# Altium footprint library COMATEL THD.PcbLib: 70 footprints (part 4 of 5)
Each footprint in its own frame and in the unit in brackets; x right, y up, seen from the top. Pads: shape width x height; smd on the part's side, far side on the other; paste and mask are expansions set on the pad; w line width, h text height; cw(c..) or ccw(c..) is an arc to the next point about the centre after c.
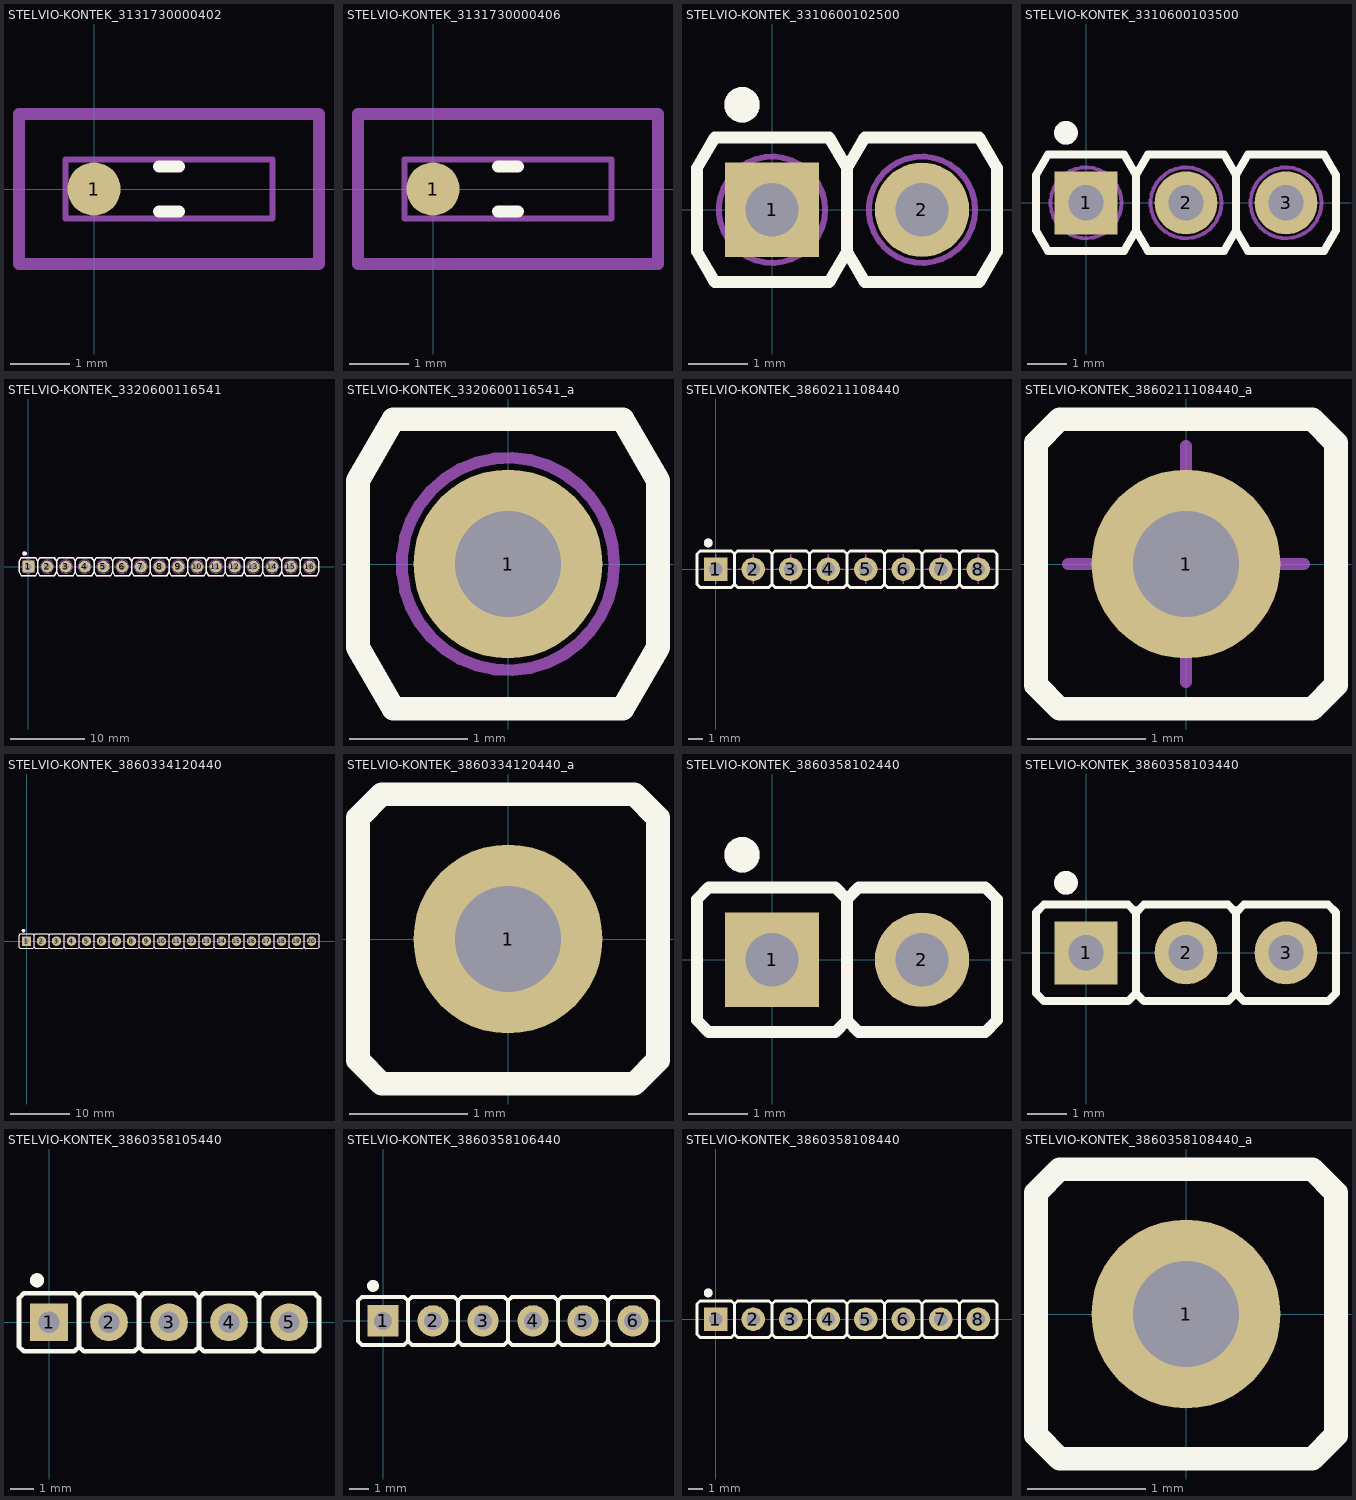
[diagram p3: the footprints below, top view; thin cyan lines are the x and y axes]

## STELVIO-KONTEK_3131730000402 [mm] "Red Insulated Jumper Pitch 2.54mm W=2.5mm L=5mm H=6.5mm"
height 6.5
pads (1):
  round 0.9 smd paste-0.46 mask-0.46: 1(0,0)
Top Overlay:
  lines w0.2: 1.1,-0.381 1.44,-0.381 ; 1.1,0.381 1.44,0.381
Mechanical 13:
  lines w0.2: -1.27,-1.27 3.81,-1.27 3.81,1.27 -1.27,1.27 -1.27,-1.27
Mechanical 14:
  lines w0.1: -0.48,-0.5 3.02,-0.5 3.02,0.5 -0.48,0.5 -0.48,-0.5
3D body "STELVIO-KONTEK_3131730000402.stp": height 6.5, standoff 0, extent -1.23,-1.25 3.77,1.25

## STELVIO-KONTEK_3131730000406 [mm] "Blue Insulated Jumper Pitch 2.54mm W=2.5mm L=5mm H=6.5mm"
height 6.5
pads (1):
  round 0.9 smd paste-0.46 mask-0.46: 1(0,0)
Top Overlay:
  lines w0.2: 1.1,-0.381 1.44,-0.381 ; 1.1,0.381 1.44,0.381
Mechanical 13:
  lines w0.2: -1.27,-1.27 3.81,-1.27 3.81,1.27 -1.27,1.27 -1.27,-1.27
Mechanical 14:
  lines w0.1: -0.48,-0.5 3.02,-0.5 3.02,0.5 -0.48,0.5 -0.48,-0.5
3D body "STELVIO-KONTEK_3131730000406.stp": height 6.5, standoff 0, extent -1.23,-1.25 3.77,1.25

## STELVIO-KONTEK_3310600102500 [mm] "2 \"U\" Pins Strip Terminals Components Support, Pitch 2.54mm"
height 5.7
pads (2):
  rect 1.6x1.6 hole 0.9: 1(0,0)
  round 1.6 hole 0.9: 2(2.54,0)
Top Overlay:
  circle w0.3: c-0.508,1.778 r0.15
  lines w0.2: 1.27,-0.705 0.97,-1.225 -0.97,-1.225 -1.27,-0.705 -1.27,0.705 -0.97,1.225 0.97,1.225 1.27,0.705 ; 1.27,-0.705 1.27,0.705 ; 1.27,-0.705 1.57,-1.225 3.51,-1.225 3.81,-0.705 3.81,0.705 3.51,1.225 1.57,1.225 1.27,0.705 ; 1.27,-0.705 1.27,0.705
Mechanical 14:
  circle w0.1: c0,0 r0.9
  circle w0.1: c2.54,0 r0.9
  circle w0.3: c-0.508,1.778 r0.15
  lines w0.1: 1.27,-0.705 0.97,-1.225 -0.97,-1.225 -1.27,-0.705 -1.27,0.705 -0.97,1.225 0.97,1.225 1.27,0.705 ; 1.27,-0.705 1.27,0.705 ; 1.27,-0.705 1.57,-1.225 3.51,-1.225 3.81,-0.705 3.81,0.705 3.51,1.225 1.57,1.225 1.27,0.705 ; 1.27,-0.705 1.27,0.705
3D body "STELVIO-KONTEK_3310600102500.stp": height 5.7, standoff -3, extent -1.27,-1.225 3.81,1.225

## STELVIO-KONTEK_3310600103500 [mm] "3 \"U\" Pins Strip Terminals Components Support, Pitch 2.54mm"
height 5.7
pads (3):
  rect 1.6x1.6 hole 0.9: 1(0,0)
  round 1.6 hole 0.9: 2(2.54,0) 3(5.08,0)
Top Overlay:
  circle w0.3: c-0.508,1.778 r0.15
  lines w0.2: 1.27,-0.705 1.27,0.705 ; 1.27,-0.705 1.57,-1.225 3.51,-1.225 3.81,-0.705 ; 1.27,-0.705 1.27,0.705 ; 1.27,-0.705 0.97,-1.225 -0.97,-1.225 -1.27,-0.705 -1.27,0.705 -0.97,1.225 0.97,1.225 1.27,0.705 ; 1.27,0.705 1.57,1.225 3.51,1.225 3.81,0.705 ; 3.81,-0.705 3.81,0.705 ; 3.81,-0.705 4.11,-1.225 6.05,-1.225 6.35,-0.705 6.35,0.705 6.05,1.225 4.11,1.225 3.81,0.705 ; 3.81,-0.705 3.81,0.705
Mechanical 14:
  circle w0.1: c5.08,0 r0.9
  circle w0.1: c2.54,0 r0.9
  circle w0.1: c0,0 r0.9
  circle w0.3: c-0.508,1.778 r0.15
  lines w0.1: 1.27,-0.705 1.27,0.705 ; 1.27,-0.705 1.57,-1.225 3.51,-1.225 3.81,-0.705 ; 1.27,-0.705 1.27,0.705 ; 1.27,-0.705 0.97,-1.225 -0.97,-1.225 -1.27,-0.705 -1.27,0.705 -0.97,1.225 0.97,1.225 1.27,0.705 ; 1.27,0.705 1.57,1.225 3.51,1.225 3.81,0.705 ; 3.81,-0.705 3.81,0.705 ; 3.81,-0.705 4.11,-1.225 6.05,-1.225 6.35,-0.705 6.35,0.705 6.05,1.225 4.11,1.225 3.81,0.705 ; 3.81,-0.705 3.81,0.705
3D body "STELVIO-KONTEK_3310600103500.stp": height 5.7, standoff -3, extent -1.27,-1.225 6.35,1.225

## STELVIO-KONTEK_3320600116541 [mm] "1of 16 \"U\" Pins Strip Terminals Components Support, Pitch 2.54mm"
height 5.7
pads (16):
  rect 1.6x1.6 hole 0.9: 1(0,0)
  round 1.6 hole 0.9: 2(2.54,0) 3(5.08,0) 4(7.62,0) 5(10.16,0) 6(12.7,0) 7(15.24,0) 8(17.78,0) 9(20.32,0) 10(22.86,0) 11(25.4,0) 12(27.94,0) 13(30.48,0) 14(33.02,0) 15(35.56,0) 16(38.1,0)
Top Overlay:
  circle w0.3: c-0.508,1.778 r0.15
  lines w0.2: 1.27,-0.705 1.57,-1.225 3.51,-1.225 3.81,-0.705 ; 1.27,-0.705 0.97,-1.225 -0.97,-1.225 -1.27,-0.705 -1.27,0.705 -0.97,1.225 0.97,1.225 1.27,0.705 ; 1.27,-0.705 1.27,0.705 ; 1.27,0.705 1.57,1.225 3.51,1.225 3.81,0.705 ; 3.81,-0.705 4.11,-1.225 6.05,-1.225 6.35,-0.705 ; 3.81,-0.705 3.81,0.705 ; 3.81,0.705 4.11,1.225 6.05,1.225 6.35,0.705 ; 6.35,-0.705 6.65,-1.225 8.59,-1.225 8.89,-0.705 ; 6.35,-0.705 6.35,0.705 ; 6.35,0.705 6.65,1.225 8.59,1.225 8.89,0.705 ; 8.89,-0.705 9.19,-1.225 11.13,-1.225 11.43,-0.705 ; 8.89,-0.705 8.89,0.705 ; 8.89,0.705 9.19,1.225 11.13,1.225 11.43,0.705 ; 11.43,-0.705 11.73,-1.225 13.67,-1.225 13.97,-0.705 ; 11.43,-0.705 11.43,0.705 ; 11.43,0.705 11.73,1.225 13.67,1.225 13.97,0.705 ; 13.97,-0.705 14.27,-1.225 16.21,-1.225 16.51,-0.705 ; 13.97,-0.705 13.97,0.705 ; 13.97,0.705 14.27,1.225 16.21,1.225 16.51,0.705 ; 16.51,-0.705 16.81,-1.225 18.75,-1.225 19.05,-0.705 ; 16.51,-0.705 16.51,0.705 ; 16.51,0.705 16.81,1.225 18.75,1.225 19.05,0.705 ; 19.05,-0.705 19.35,-1.225 21.29,-1.225 21.59,-0.705 ; 19.05,-0.705 19.05,0.705 ; 19.05,0.705 19.35,1.225 21.29,1.225 21.59,0.705 ; 21.59,-0.705 21.89,-1.225 23.83,-1.225 24.13,-0.705 ; 21.59,-0.705 21.59,0.705 ; 21.59,0.705 21.89,1.225 23.83,1.225 24.13,0.705 ; 24.13,-0.705 24.43,-1.225 26.37,-1.225 26.67,-0.705 ; 24.13,-0.705 24.13,0.705 ; 24.13,0.705 24.43,1.225 26.37,1.225 26.67,0.705 ; 26.67,-0.705 26.97,-1.225 28.91,-1.225 29.21,-0.705 ; 26.67,-0.705 26.67,0.705 ; 26.67,0.705 26.97,1.225 28.91,1.225 29.21,0.705 ; 29.21,-0.705 29.51,-1.225 31.45,-1.225 31.75,-0.705 ; 29.21,-0.705 29.21,0.705 ; 29.21,0.705 29.51,1.225 31.45,1.225 31.75,0.705 ; 31.75,-0.705 32.05,-1.225 33.99,-1.225 34.29,-0.705 ; 31.75,-0.705 31.75,0.705 ; 31.75,0.705 32.05,1.225 33.99,1.225 34.29,0.705 ; 34.29,-0.705 34.59,-1.225 36.53,-1.225 36.83,-0.705 ; 34.29,-0.705 34.29,0.705 ; 34.29,0.705 34.59,1.225 36.53,1.225 36.83,0.705 ; 36.83,-0.705 37.13,-1.225 39.07,-1.225 39.37,-0.705 39.37,0.705 39.07,1.225 37.13,1.225 36.83,0.705 ; 36.83,-0.705 36.83,0.705
Mechanical 8:
  lines w0.1: -0.5,0 0,0 ; 0,-0.5 0,0 ; 0,0.5 0,0 ; 0.5,0 0,0 ; 2.04,0 2.54,0 ; 2.54,-0.5 2.54,0 ; 2.54,0.5 2.54,0 ; 3.04,0 2.54,0 ; 4.58,0 5.08,0 ; 5.08,-0.5 5.08,0 ; 5.08,0.5 5.08,0 ; 5.58,0 5.08,0 ; 7.12,0 7.62,0 ; 7.62,-0.5 7.62,0 ; 7.62,0.5 7.62,0 ; 8.12,0 7.62,0 ; 9.66,0 10.16,0 ; 10.16,-0.5 10.16,0 ; 10.16,0.5 10.16,0 ; 10.66,0 10.16,0 ; 12.2,0 12.7,0 ; 12.7,-0.5 12.7,0 ; 12.7,0.5 12.7,0 ; 13.2,0 12.7,0 ; 14.74,0 15.24,0 ; 15.24,-0.5 15.24,0 ; 15.24,0.5 15.24,0 ; 15.74,0 15.24,0 ; 17.28,0 17.78,0 ; 17.78,-0.5 17.78,0 ; 17.78,0.5 17.78,0 ; 18.28,0 17.78,0 ; 19.82,0 20.32,0 ; 20.32,-0.5 20.32,0 ; 20.32,0.5 20.32,0 ; 20.82,0 20.32,0 ; 22.36,0 22.86,0 ; 22.86,-0.5 22.86,0 ; 22.86,0.5 22.86,0 ; 23.36,0 22.86,0 ; 24.9,0 25.4,0 ; 25.4,-0.5 25.4,0 ; 25.4,0.5 25.4,0 ; 25.9,0 25.4,0 ; 27.44,0 27.94,0 ; 27.94,-0.5 27.94,0 ; 27.94,0.5 27.94,0 ; 28.44,0 27.94,0 ; 29.98,0 30.48,0 ; 30.48,-0.5 30.48,0 ; 30.48,0.5 30.48,0 ; 30.98,0 30.48,0 ; 32.52,0 33.02,0 ; 33.02,-0.5 33.02,0 ; 33.02,0.5 33.02,0 ; 33.52,0 33.02,0 ; 35.06,0 35.56,0 ; 35.56,-0.5 35.56,0 ; 35.56,0.5 35.56,0 ; 36.06,0 35.56,0 ; 37.6,0 38.1,0 ; 38.1,-0.5 38.1,0 ; 38.1,0.5 38.1,0 ; 38.6,0 38.1,0
Mechanical 14:
  circle w0.3: c-0.508,1.778 r0.15
  circle w0.1: c38.1,0 r0.9
  circle w0.1: c35.56,0 r0.9
  circle w0.1: c33.02,0 r0.9
  circle w0.1: c30.48,0 r0.9
  circle w0.1: c27.94,0 r0.9
  circle w0.1: c25.4,0 r0.9
  circle w0.1: c22.86,0 r0.9
  circle w0.1: c20.32,0 r0.9
  circle w0.1: c17.78,0 r0.9
  circle w0.1: c15.24,0 r0.9
  circle w0.1: c12.7,0 r0.9
  circle w0.1: c10.16,0 r0.9
  circle w0.1: c7.62,0 r0.9
  circle w0.1: c5.08,0 r0.9
  circle w0.1: c2.54,0 r0.9
  circle w0.1: c0,0 r0.9
  lines w0.1: 1.27,-0.705 1.57,-1.225 3.51,-1.225 3.81,-0.705 ; 1.27,-0.705 0.97,-1.225 -0.97,-1.225 -1.27,-0.705 -1.27,0.705 -0.97,1.225 0.97,1.225 1.27,0.705 ; 1.27,-0.705 1.27,0.705 ; 1.27,0.705 1.57,1.225 3.51,1.225 3.81,0.705 ; 3.81,-0.705 4.11,-1.225 6.05,-1.225 6.35,-0.705 ; 3.81,-0.705 3.81,0.705 ; 3.81,0.705 4.11,1.225 6.05,1.225 6.35,0.705 ; 6.35,-0.705 6.65,-1.225 8.59,-1.225 8.89,-0.705 ; 6.35,-0.705 6.35,0.705 ; 6.35,0.705 6.65,1.225 8.59,1.225 8.89,0.705 ; 8.89,-0.705 9.19,-1.225 11.13,-1.225 11.43,-0.705 ; 8.89,-0.705 8.89,0.705 ; 8.89,0.705 9.19,1.225 11.13,1.225 11.43,0.705 ; 11.43,-0.705 11.73,-1.225 13.67,-1.225 13.97,-0.705 ; 11.43,-0.705 11.43,0.705 ; 11.43,0.705 11.73,1.225 13.67,1.225 13.97,0.705 ; 13.97,-0.705 14.27,-1.225 16.21,-1.225 16.51,-0.705 ; 13.97,-0.705 13.97,0.705 ; 13.97,0.705 14.27,1.225 16.21,1.225 16.51,0.705 ; 16.51,-0.705 16.81,-1.225 18.75,-1.225 19.05,-0.705 ; 16.51,-0.705 16.51,0.705 ; 16.51,0.705 16.81,1.225 18.75,1.225 19.05,0.705 ; 19.05,-0.705 19.35,-1.225 21.29,-1.225 21.59,-0.705 ; 19.05,-0.705 19.05,0.705 ; 19.05,0.705 19.35,1.225 21.29,1.225 21.59,0.705 ; 21.59,-0.705 21.89,-1.225 23.83,-1.225 24.13,-0.705 ; 21.59,-0.705 21.59,0.705 ; 21.59,0.705 21.89,1.225 23.83,1.225 24.13,0.705 ; 24.13,-0.705 24.43,-1.225 26.37,-1.225 26.67,-0.705 ; 24.13,-0.705 24.13,0.705 ; 24.13,0.705 24.43,1.225 26.37,1.225 26.67,0.705 ; 26.67,-0.705 26.97,-1.225 28.91,-1.225 29.21,-0.705 ; 26.67,-0.705 26.67,0.705 ; 26.67,0.705 26.97,1.225 28.91,1.225 29.21,0.705 ; 29.21,-0.705 29.51,-1.225 31.45,-1.225 31.75,-0.705 ; 29.21,-0.705 29.21,0.705 ; 29.21,0.705 29.51,1.225 31.45,1.225 31.75,0.705 ; 31.75,-0.705 32.05,-1.225 33.99,-1.225 34.29,-0.705 ; 31.75,-0.705 31.75,0.705 ; 31.75,0.705 32.05,1.225 33.99,1.225 34.29,0.705 ; 34.29,-0.705 34.59,-1.225 36.53,-1.225 36.83,-0.705 ; 34.29,-0.705 34.29,0.705 ; 34.29,0.705 34.59,1.225 36.53,1.225 36.83,0.705 ; 36.83,-0.705 37.13,-1.225 39.07,-1.225 39.37,-0.705 39.37,0.705 39.07,1.225 37.13,1.225 36.83,0.705 ; 36.83,-0.705 36.83,0.705
3D body "STELVIO-KONTEK_3320600116541.stp": height 5.7, standoff -3, extent -1.27,-1.225 39.37,1.225

## STELVIO-KONTEK_3320600116541_a [mm] "1of1 of 1 of 16 \"U\" Pins Strip Terminals Components Support, Pitch 2.54mm"
height 5.7
pads (1):
  round 1.6 hole 0.9: 1(0,0)
Top Overlay:
  lines w0.2: -1.27,-0.705 -0.97,-1.225 0.97,-1.225 1.27,-0.705 1.27,0.705 0.97,1.225 -0.97,1.225 -1.27,0.705 -1.27,-0.705
Mechanical 14:
  circle w0.1: c0,0 r0.9
  lines w0.1: -1.27,-0.705 -0.97,-1.225 0.97,-1.225 1.27,-0.705 1.27,0.705 0.97,1.225 -0.97,1.225 -1.27,0.705 -1.27,-0.705
3D body "STELVIO-KONTEK_3320600116541_a.stp": height 5.7, standoff -3, extent -1.27,-1.225 1.27,1.225

## STELVIO-KONTEK_3860211108440 [mm] "Wire-Wrap contact (Pin Length= 16.5mm)"
height 18.2
pads (8):
  rect 1.6x1.6 hole 0.9: 1(0,0)
  round 1.6 hole 0.9: 2(2.54,0) 3(5.08,0) 4(7.62,0) 5(10.16,0) 6(12.7,0) 7(15.24,0) 8(17.78,0)
Top Overlay:
  circle w0.3: c-0.508,1.778 r0.15
  lines w0.2: 1.27,-1.025 1.27,1.025 ; 1.27,-1.025 1.47,-1.225 3.61,-1.225 3.81,-1.025 ; 1.27,-1.025 1.27,1.025 ; 1.27,-1.025 1.07,-1.225 -1.07,-1.225 -1.27,-1.025 -1.27,1.025 -1.07,1.225 1.07,1.225 1.27,1.025 ; 1.27,1.025 1.47,1.225 3.61,1.225 3.81,1.025 ; 3.81,-1.025 3.81,1.025 ; 3.81,-1.025 4.01,-1.225 6.15,-1.225 6.35,-1.025 ; 3.81,-1.025 3.81,1.025 ; 3.81,1.025 4.01,1.225 6.15,1.225 6.35,1.025 ; 6.35,-1.025 6.35,1.025 ; 6.35,-1.025 6.55,-1.225 8.69,-1.225 8.89,-1.025 ; 6.35,-1.025 6.35,1.025 ; 6.35,1.025 6.55,1.225 8.69,1.225 8.89,1.025 ; 8.89,-1.025 8.89,1.025 ; 8.89,-1.025 9.09,-1.225 11.23,-1.225 11.43,-1.025 ; 8.89,-1.025 8.89,1.025 ; 8.89,1.025 9.09,1.225 11.23,1.225 11.43,1.025 ; 11.43,-1.025 11.43,1.025 ; 11.43,-1.025 11.63,-1.225 13.77,-1.225 13.97,-1.025 ; 11.43,-1.025 11.43,1.025 ; 11.43,1.025 11.63,1.225 13.77,1.225 13.97,1.025 ; 13.97,-1.025 13.97,1.025 ; 13.97,-1.025 14.17,-1.225 16.31,-1.225 16.51,-1.025 ; 13.97,-1.025 13.97,1.025 ; 13.97,1.025 14.17,1.225 16.31,1.225 16.51,1.025 ; 16.51,-1.025 16.51,1.025 ; 16.51,-1.025 16.71,-1.225 18.85,-1.225 19.05,-1.025 19.05,1.025 18.85,1.225 16.71,1.225 16.51,1.025 ; 16.51,-1.025 16.51,1.025
Mechanical 8:
  lines w0.1: -1,0 0,0 ; 0,-1 0,0 ; 0,1 0,0 ; 1,0 0,0 ; 1.54,0 2.54,0 ; 2.54,-1 2.54,0 ; 2.54,1 2.54,0 ; 3.54,0 2.54,0 ; 4.08,0 5.08,0 ; 5.08,-1 5.08,0 ; 5.08,1 5.08,0 ; 6.08,0 5.08,0 ; 6.62,0 7.62,0 ; 7.62,-1 7.62,0 ; 7.62,1 7.62,0 ; 8.62,0 7.62,0 ; 9.16,0 10.16,0 ; 10.16,-1 10.16,0 ; 10.16,1 10.16,0 ; 11.16,0 10.16,0 ; 11.7,0 12.7,0 ; 12.7,-1 12.7,0 ; 12.7,1 12.7,0 ; 13.7,0 12.7,0 ; 14.24,0 15.24,0 ; 15.24,-1 15.24,0 ; 15.24,1 15.24,0 ; 16.24,0 15.24,0 ; 16.78,0 17.78,0 ; 17.78,-1 17.78,0 ; 17.78,1 17.78,0 ; 18.78,0 17.78,0
Mechanical 14:
  circle w0.3: c-0.508,1.778 r0.15
  lines w0.1: 1.27,-1.025 1.47,-1.225 3.61,-1.225 3.81,-1.025 ; 1.27,-1.025 1.27,1.025 ; 1.27,-1.025 1.07,-1.225 -1.07,-1.225 -1.27,-1.025 -1.27,1.025 -1.07,1.225 1.07,1.225 1.27,1.025 ; 1.27,-1.025 1.27,1.025 ; 1.27,1.025 1.47,1.225 3.61,1.225 3.81,1.025 ; 3.81,-1.025 4.01,-1.225 6.15,-1.225 6.35,-1.025 ; 3.81,-1.025 3.81,1.025 ; 3.81,-1.025 3.81,1.025 ; 3.81,1.025 4.01,1.225 6.15,1.225 6.35,1.025 ; 6.35,-1.025 6.55,-1.225 8.69,-1.225 8.89,-1.025 ; 6.35,-1.025 6.35,1.025 ; 6.35,-1.025 6.35,1.025 ; 6.35,1.025 6.55,1.225 8.69,1.225 8.89,1.025 ; 8.89,-1.025 9.09,-1.225 11.23,-1.225 11.43,-1.025 ; 8.89,-1.025 8.89,1.025 ; 8.89,-1.025 8.89,1.025 ; 8.89,1.025 9.09,1.225 11.23,1.225 11.43,1.025 ; 11.43,-1.025 11.63,-1.225 13.77,-1.225 13.97,-1.025 ; 11.43,-1.025 11.43,1.025 ; 11.43,-1.025 11.43,1.025 ; 11.43,1.025 11.63,1.225 13.77,1.225 13.97,1.025 ; 13.97,-1.025 14.17,-1.225 16.31,-1.225 16.51,-1.025 ; 13.97,-1.025 13.97,1.025 ; 13.97,-1.025 13.97,1.025 ; 13.97,1.025 14.17,1.225 16.31,1.225 16.51,1.025 ; 16.51,-1.025 16.71,-1.225 18.85,-1.225 19.05,-1.025 19.05,1.025 18.85,1.225 16.71,1.225 16.51,1.025 ; 16.51,-1.025 16.51,1.025 ; 16.51,-1.025 16.51,1.025
3D body "STELVIO-KONTEK_3860211108440.stp": height 18.2, standoff -3.8, extent -1.27,-1.225 19.05,1.225

## STELVIO-KONTEK_3860211108440_a [mm] "Wire-Wrap contact (Pin Length= 16.5mm)"
height 18.2
pads (1):
  round 1.6 hole 0.9: 1(0,0)
Top Overlay:
  lines w0.2: -1.27,-1.025 -1.27,1.025 -1.07,1.225 1.07,1.225 1.27,1.025 1.27,-1.025 1.07,-1.225 -1.07,-1.225 -1.27,-1.025
Mechanical 8:
  lines w0.1: -1,0 0,0 ; 0,-1 0,0 ; 0,1 0,0 ; 1,0 0,0
Mechanical 14:
  lines w0.1: -1.27,-1.025 -1.07,-1.225 1.07,-1.225 1.27,-1.025 1.27,1.025 1.07,1.225 -1.07,1.225 -1.27,1.025 -1.27,-1.025
3D body "STELVIO-KONTEK_3860211108440_a.stp": height 18.2, standoff -3.8, extent -1.27,-1.225 1.27,1.225

## STELVIO-KONTEK_3860334120440 [mm] "Wire-Wrap contact (Pin Length= 7.5mm)"
height 9.2
pads (20):
  rect 1.6x1.6 hole 0.9: 1(0,0)
  round 1.6 hole 0.9: 2(2.54,0) 3(5.08,0) 4(7.62,0) 5(10.16,0) 6(12.7,0) 7(15.24,0) 8(17.78,0) 9(20.32,0) 10(22.86,0) 11(25.4,0) 12(27.94,0) 13(30.48,0) 14(33.02,0) 15(35.56,0) 16(38.1,0) 17(40.64,0) 18(43.18,0) 19(45.72,0) 20(48.26,0)
Top Overlay:
  drawing of 161 lines, arcs and shapes, not listed
Mechanical 14:
  drawing of 161 lines, arcs and shapes, not listed
3D body "STELVIO-KONTEK_3860334120440.stp": height 9.2, standoff -3.3, extent -1.27,-1.225 49.53,1.225

## STELVIO-KONTEK_3860334120440_a [mm] "Wire-Wrap contact (Pin Length= 7.5mm)"
height 9.2
pads (1):
  round 1.6 hole 0.9: 1(0,0)
Top Overlay:
  lines w0.2: -1.27,-1.025 -1.27,1.025 -1.07,1.225 1.07,1.225 1.27,1.025 1.27,-1.025 1.07,-1.225 -1.07,-1.225 -1.27,-1.025
Mechanical 14:
  lines w0.1: -1.27,-1.025 -1.07,-1.225 1.07,-1.225 1.27,-1.025 1.27,1.025 1.07,1.225 -1.07,1.225 -1.27,1.025 -1.27,-1.025
3D body "STELVIO-KONTEK_3860334120440_a.stp": height 9.2, standoff -3.3, extent -1.27,-1.225 1.27,1.225

## STELVIO-KONTEK_3860358102440 [mm] "2 Contacts Straight Strip Header Pitch 2.54mm L=6.3mm ''Mini-Wire-Wrap''"
height 8
pads (2):
  rect 1.6x1.6 hole 0.9: 1(0,0)
  round 1.6 hole 0.9: 2(2.54,0)
Top Overlay:
  circle w0.3: c-0.508,1.778 r0.15
  lines w0.2: 1.27,-1.025 1.07,-1.225 -1.07,-1.225 -1.27,-1.025 -1.27,1.025 -1.07,1.225 1.07,1.225 1.27,1.025 ; 1.27,-1.025 1.27,1.025 ; 1.27,-1.025 1.47,-1.225 3.61,-1.225 3.81,-1.025 3.81,1.025 3.61,1.225 1.47,1.225 1.27,1.025
Mechanical 14:
  circle w0.3: c-0.508,1.778 r0.15
  lines w0.1: 1.27,-1.025 1.07,-1.225 -1.07,-1.225 -1.27,-1.025 -1.27,1.025 -1.07,1.225 1.07,1.225 1.27,1.025 ; 1.27,-1.025 1.27,1.025 ; 1.27,-1.025 1.47,-1.225 3.61,-1.225 3.81,-1.025 3.81,1.025 3.61,1.225 1.47,1.225 1.27,1.025
3D body "STELVIO-KONTEK_3860358102440.stp": height 8, standoff -3.2, extent -1.27,-1.225 3.81,1.225

## STELVIO-KONTEK_3860358103440 [mm] "3 Contacts Straight Strip Header Pitch 2.54mm L=6.3mm ''Mini-Wire-Wrap''"
height 8
pads (3):
  rect 1.6x1.6 hole 0.9: 1(0,0)
  round 1.6 hole 0.9: 2(2.54,0) 3(5.08,0)
Top Overlay:
  circle w0.3: c-0.508,1.778 r0.15
  lines w0.2: 1.27,-1.025 1.47,-1.225 3.61,-1.225 3.81,-1.025 ; 1.27,-1.025 1.27,1.025 ; 1.27,-1.025 1.07,-1.225 -1.07,-1.225 -1.27,-1.025 -1.27,1.025 -1.07,1.225 1.07,1.225 1.27,1.025 ; 1.27,1.025 1.47,1.225 3.61,1.225 3.81,1.025 ; 3.81,-1.025 4.01,-1.225 6.15,-1.225 6.35,-1.025 6.35,1.025 6.15,1.225 4.01,1.225 3.81,1.025 ; 3.81,-1.025 3.81,1.025
Mechanical 14:
  circle w0.3: c-0.508,1.778 r0.15
  lines w0.1: 1.27,-1.025 1.47,-1.225 3.61,-1.225 3.81,-1.025 ; 1.27,-1.025 1.27,1.025 ; 1.27,-1.025 1.07,-1.225 -1.07,-1.225 -1.27,-1.025 -1.27,1.025 -1.07,1.225 1.07,1.225 1.27,1.025 ; 1.27,1.025 1.47,1.225 3.61,1.225 3.81,1.025 ; 3.81,-1.025 4.01,-1.225 6.15,-1.225 6.35,-1.025 6.35,1.025 6.15,1.225 4.01,1.225 3.81,1.025 ; 3.81,-1.025 3.81,1.025
3D body "STELVIO-KONTEK_3860358103440.stp": height 8, standoff -3.2, extent -1.27,-1.225 6.35,1.225

## STELVIO-KONTEK_3860358105440 [mm] "5 Contacts Straight Strip Header Pitch 2.54mm L=6.3mm ''Mini-Wire-Wrap''"
height 8
pads (5):
  rect 1.6x1.6 hole 0.9: 1(0,0)
  round 1.6 hole 0.9: 2(2.54,0) 3(5.08,0) 4(7.62,0) 5(10.16,0)
Top Overlay:
  circle w0.3: c-0.508,1.778 r0.15
  lines w0.2: 1.27,-1.025 1.47,-1.225 3.61,-1.225 3.81,-1.025 ; 1.27,-1.025 1.27,1.025 ; 1.27,-1.025 1.07,-1.225 -1.07,-1.225 -1.27,-1.025 -1.27,1.025 -1.07,1.225 1.07,1.225 1.27,1.025 ; 1.27,1.025 1.47,1.225 3.61,1.225 3.81,1.025 ; 3.81,-1.025 4.01,-1.225 6.15,-1.225 6.35,-1.025 ; 3.81,-1.025 3.81,1.025 ; 3.81,1.025 4.01,1.225 6.15,1.225 6.35,1.025 ; 6.35,-1.025 6.55,-1.225 8.69,-1.225 8.89,-1.025 ; 6.35,-1.025 6.35,1.025 ; 6.35,1.025 6.55,1.225 8.69,1.225 8.89,1.025 ; 8.89,-1.025 8.89,1.025 ; 8.89,-1.025 9.09,-1.225 11.23,-1.225 11.43,-1.025 11.43,1.025 11.23,1.225 9.09,1.225 8.89,1.025
Mechanical 14:
  circle w0.3: c-0.508,1.778 r0.15
  lines w0.1: 1.27,-1.025 1.47,-1.225 3.61,-1.225 3.81,-1.025 ; 1.27,-1.025 1.27,1.025 ; 1.27,-1.025 1.07,-1.225 -1.07,-1.225 -1.27,-1.025 -1.27,1.025 -1.07,1.225 1.07,1.225 1.27,1.025 ; 1.27,1.025 1.47,1.225 3.61,1.225 3.81,1.025 ; 3.81,-1.025 4.01,-1.225 6.15,-1.225 6.35,-1.025 ; 3.81,-1.025 3.81,1.025 ; 3.81,1.025 4.01,1.225 6.15,1.225 6.35,1.025 ; 6.35,-1.025 6.35,1.025 ; 6.35,-1.025 6.55,-1.225 8.69,-1.225 8.89,-1.025 ; 6.35,1.025 6.55,1.225 8.69,1.225 8.89,1.025 ; 8.89,-1.025 8.89,1.025 ; 8.89,-1.025 9.09,-1.225 11.23,-1.225 11.43,-1.025 11.43,1.025 11.23,1.225 9.09,1.225 8.89,1.025
3D body "STELVIO-KONTEK_3860358105440.stp": height 8, standoff -3.2, extent -1.27,-1.225 11.43,1.225

## STELVIO-KONTEK_3860358106440 [mm] "6 Contacts Straight Strip Header Pitch 2.54mm L=6.3mm ''Mini-Wire-Wrap''"
height 8
pads (6):
  rect 1.6x1.6 hole 0.9: 1(0,0)
  round 1.6 hole 0.9: 2(2.54,0) 3(5.08,0) 4(7.62,0) 5(10.16,0) 6(12.7,0)
Top Overlay:
  circle w0.3: c-0.508,1.778 r0.15
  lines w0.2: 1.27,-1.025 1.47,-1.225 3.61,-1.225 3.81,-1.025 ; 1.27,-1.025 1.27,1.025 ; 1.27,-1.025 1.07,-1.225 -1.07,-1.225 -1.27,-1.025 -1.27,1.025 -1.07,1.225 1.07,1.225 1.27,1.025 ; 1.27,1.025 1.47,1.225 3.61,1.225 3.81,1.025 ; 3.81,-1.025 4.01,-1.225 6.15,-1.225 6.35,-1.025 ; 3.81,-1.025 3.81,1.025 ; 3.81,1.025 4.01,1.225 6.15,1.225 6.35,1.025 ; 6.35,-1.025 6.55,-1.225 8.69,-1.225 8.89,-1.025 ; 6.35,-1.025 6.35,1.025 ; 6.35,1.025 6.55,1.225 8.69,1.225 8.89,1.025 ; 8.89,-1.025 8.89,1.025 ; 8.89,-1.025 9.09,-1.225 11.23,-1.225 11.43,-1.025 ; 8.89,1.025 9.09,1.225 11.23,1.225 11.43,1.025 ; 11.43,-1.025 11.43,1.025 ; 11.43,-1.025 11.63,-1.225 13.77,-1.225 13.97,-1.025 13.97,1.025 13.77,1.225 11.63,1.225 11.43,1.025
Mechanical 14:
  circle w0.3: c-0.508,1.778 r0.15
  lines w0.1: 1.27,-1.025 1.47,-1.225 3.61,-1.225 3.81,-1.025 ; 1.27,-1.025 1.27,1.025 ; 1.27,-1.025 1.07,-1.225 -1.07,-1.225 -1.27,-1.025 -1.27,1.025 -1.07,1.225 1.07,1.225 1.27,1.025 ; 1.27,1.025 1.47,1.225 3.61,1.225 3.81,1.025 ; 3.81,-1.025 4.01,-1.225 6.15,-1.225 6.35,-1.025 ; 3.81,-1.025 3.81,1.025 ; 3.81,1.025 4.01,1.225 6.15,1.225 6.35,1.025 ; 6.35,-1.025 6.35,1.025 ; 6.35,-1.025 6.55,-1.225 8.69,-1.225 8.89,-1.025 ; 6.35,1.025 6.55,1.225 8.69,1.225 8.89,1.025 ; 8.89,-1.025 8.89,1.025 ; 8.89,-1.025 9.09,-1.225 11.23,-1.225 11.43,-1.025 ; 8.89,1.025 9.09,1.225 11.23,1.225 11.43,1.025 ; 11.43,-1.025 11.43,1.025 ; 11.43,-1.025 11.63,-1.225 13.77,-1.225 13.97,-1.025 13.97,1.025 13.77,1.225 11.63,1.225 11.43,1.025
3D body "STELVIO-KONTEK_3860358106440.stp": height 8, standoff -3.2, extent -1.27,-1.225 13.97,1.225

## STELVIO-KONTEK_3860358108440 [mm] "8 Contacts Straight Strip Header Pitch 2.54mm L=6.3mm ''Mini-Wire-Wrap''"
height 8
pads (8):
  rect 1.6x1.6 hole 0.9: 1(0,0)
  round 1.6 hole 0.9: 2(2.54,0) 3(5.08,0) 4(7.62,0) 5(10.16,0) 6(12.7,0) 7(15.24,0) 8(17.78,0)
Top Overlay:
  circle w0.3: c-0.508,1.778 r0.15
  lines w0.2: 1.27,-1.025 1.47,-1.225 3.61,-1.225 3.81,-1.025 ; 1.27,-1.025 1.27,1.025 ; 1.27,-1.025 1.07,-1.225 -1.07,-1.225 -1.27,-1.025 -1.27,1.025 -1.07,1.225 1.07,1.225 1.27,1.025 ; 1.27,1.025 1.47,1.225 3.61,1.225 3.81,1.025 ; 3.81,-1.025 4.01,-1.225 6.15,-1.225 6.35,-1.025 ; 3.81,-1.025 3.81,1.025 ; 3.81,1.025 4.01,1.225 6.15,1.225 6.35,1.025 ; 6.35,-1.025 6.55,-1.225 8.69,-1.225 8.89,-1.025 ; 6.35,-1.025 6.35,1.025 ; 6.35,1.025 6.55,1.225 8.69,1.225 8.89,1.025 ; 8.89,-1.025 9.09,-1.225 11.23,-1.225 11.43,-1.025 ; 8.89,-1.025 8.89,1.025 ; 8.89,1.025 9.09,1.225 11.23,1.225 11.43,1.025 ; 11.43,-1.025 11.63,-1.225 13.77,-1.225 13.97,-1.025 ; 11.43,-1.025 11.43,1.025 ; 11.43,1.025 11.63,1.225 13.77,1.225 13.97,1.025 ; 13.97,-1.025 14.17,-1.225 16.31,-1.225 16.51,-1.025 ; 13.97,-1.025 13.97,1.025 ; 13.97,1.025 14.17,1.225 16.31,1.225 16.51,1.025 ; 16.51,-1.025 16.71,-1.225 18.85,-1.225 19.05,-1.025 19.05,1.025 18.85,1.225 16.71,1.225 16.51,1.025 ; 16.51,-1.025 16.51,1.025
Mechanical 14:
  circle w0.3: c-0.508,1.778 r0.15
  lines w0.1: 1.27,-1.025 1.47,-1.225 3.61,-1.225 3.81,-1.025 ; 1.27,-1.025 1.07,-1.225 -1.07,-1.225 -1.27,-1.025 -1.27,1.025 -1.07,1.225 1.07,1.225 1.27,1.025 ; 1.27,-1.025 1.27,1.025 ; 1.27,1.025 1.47,1.225 3.61,1.225 3.81,1.025 ; 3.81,-1.025 4.01,-1.225 6.15,-1.225 6.35,-1.025 ; 3.81,-1.025 3.81,1.025 ; 3.81,1.025 4.01,1.225 6.15,1.225 6.35,1.025 ; 6.35,-1.025 6.55,-1.225 8.69,-1.225 8.89,-1.025 ; 6.35,-1.025 6.35,1.025 ; 6.35,1.025 6.55,1.225 8.69,1.225 8.89,1.025 ; 8.89,-1.025 9.09,-1.225 11.23,-1.225 11.43,-1.025 ; 8.89,-1.025 8.89,1.025 ; 8.89,1.025 9.09,1.225 11.23,1.225 11.43,1.025 ; 11.43,-1.025 11.63,-1.225 13.77,-1.225 13.97,-1.025 ; 11.43,-1.025 11.43,1.025 ; 11.43,1.025 11.63,1.225 13.77,1.225 13.97,1.025 ; 13.97,-1.025 14.17,-1.225 16.31,-1.225 16.51,-1.025 ; 13.97,-1.025 13.97,1.025 ; 13.97,1.025 14.17,1.225 16.31,1.225 16.51,1.025 ; 16.51,-1.025 16.71,-1.225 18.85,-1.225 19.05,-1.025 19.05,1.025 18.85,1.225 16.71,1.225 16.51,1.025 ; 16.51,-1.025 16.51,1.025
3D body "STELVIO-KONYEK_3860358108440.stp": height 8, standoff -3.2, extent -1.27,-1.225 19.05,1.225

## STELVIO-KONTEK_3860358108440_a [mm] "1 Out of 8 Contacts of  Straight Strip Header Pitch 2.54mm L=6.3mm ''Mini-Wire-Wrap''"
height 8
pads (1):
  round 1.6 hole 0.9: 1(0,0)
Top Overlay:
  lines w0.2: -1.27,-1.025 -1.07,-1.225 1.07,-1.225 1.27,-1.025 1.27,1.025 1.07,1.225 -1.07,1.225 -1.27,1.025 -1.27,-1.025
Mechanical 14:
  lines w0.1: -1.27,-1.025 -1.27,1.025 -1.07,1.225 1.07,1.225 1.27,1.025 1.27,-1.025 1.07,-1.225 -1.07,-1.225 -1.27,-1.025
3D body "STELVIO-KONTEK_3860358108440_a.stp": height 8, standoff -3.2, extent -1.27,-1.225 1.27,1.225